# Altium footprint library Gate Driver Board.PcbLib: 123 footprints (part 2 of 8)
Each footprint in its own frame and in the unit in brackets; x right, y up, seen from the top. Pads: shape width x height; smd on the part's side, far side on the other; paste and mask are expansions set on the pad; w line width, h text height; cw(c..) or ccw(c..) is an arc to the next point about the centre after c.
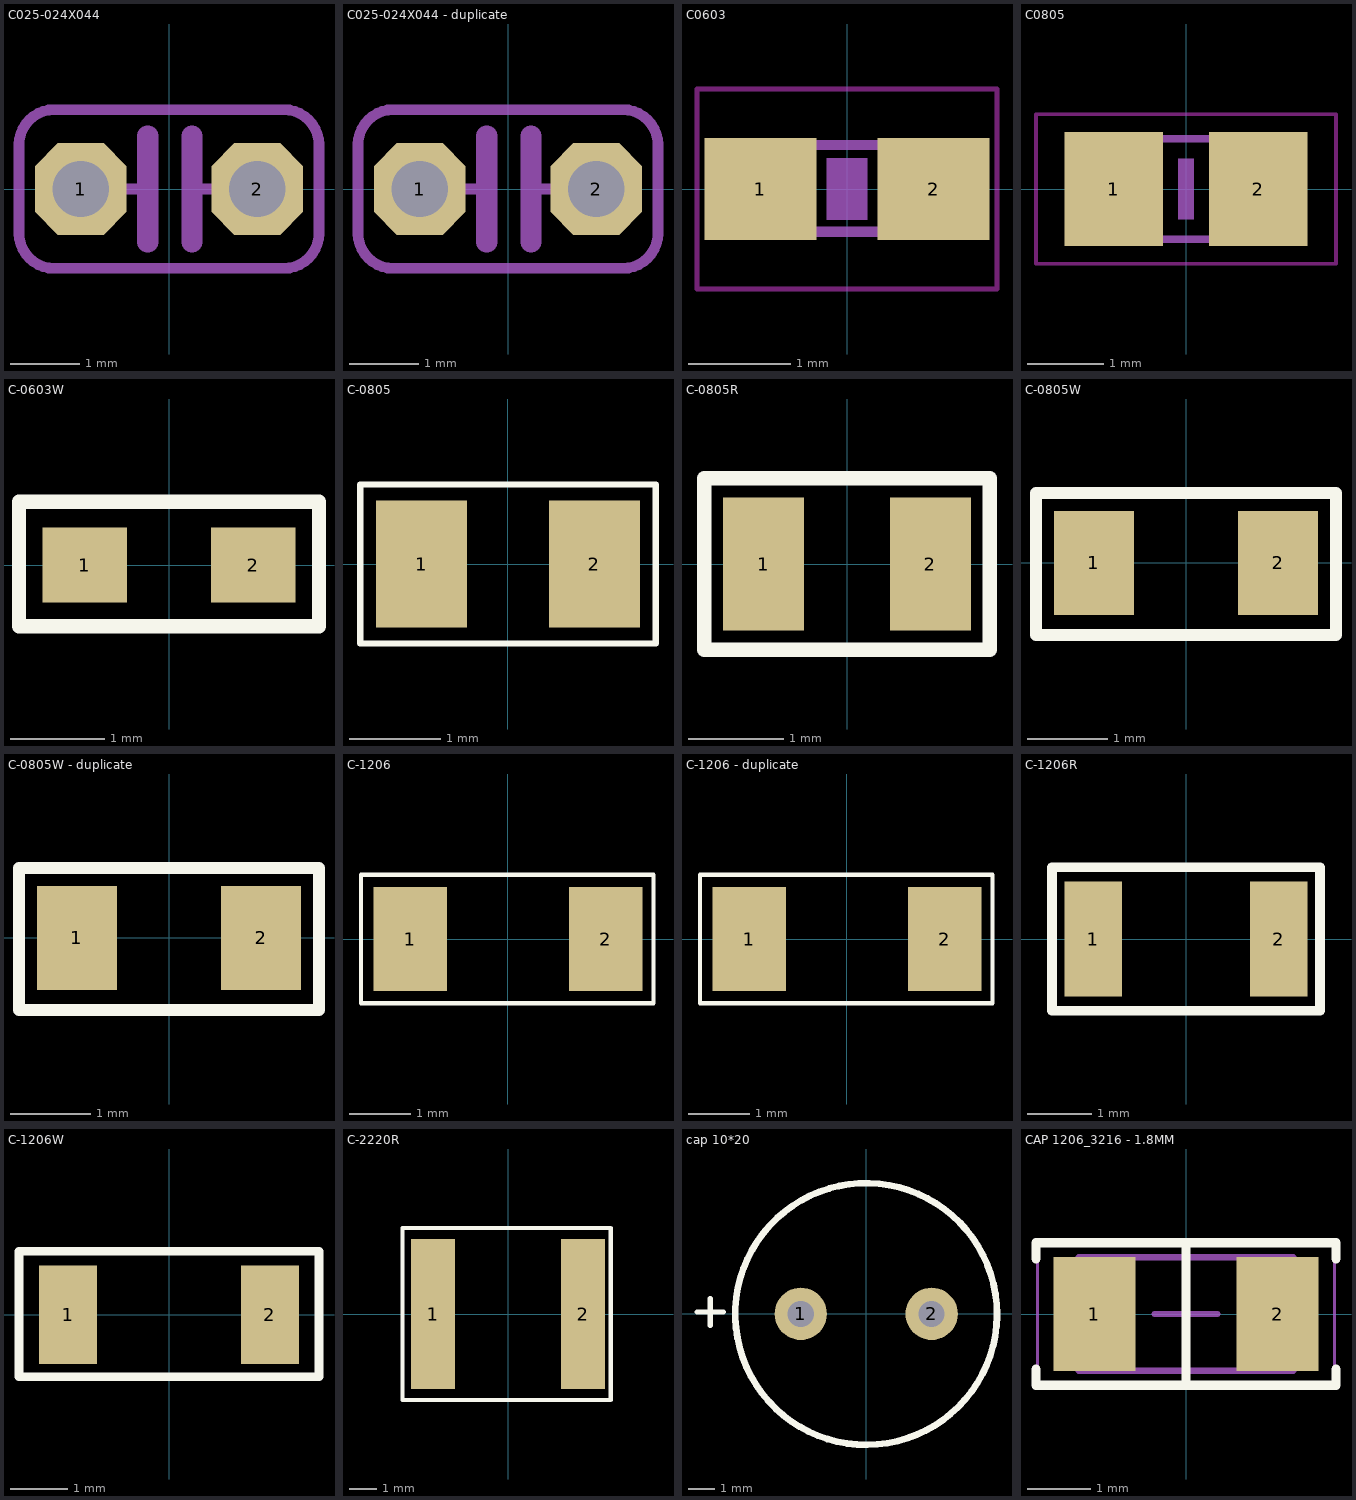
[diagram p1: the footprints below, top view; thin cyan lines are the x and y axes]

## C025-024X044 [mil] "C025-024X044"
pads (2):
  oct 52x52 / inner round 0 / far side oct 52x52 hole 32: 1(-50,0) 2(50,0)
Assembly Bottom:
  lines w6: -50,0 -12,0 ; 13,0 50,0
3D Body Bottom:
  lines w6: -85,-25 ccw(c-65,-25) -65,-45 65,-45 ccw(c65,-25) 85,-25 85,25 ccw(c65,25) 65,45 -65,45 ccw(c-65,25) -85,25 -85,-25
  lines w12: -12,-30 -12,30 ; 13,-30 13,30
3D body: height 150, standoff 0, extent 9.75,-3.25 53.25,3.25
3D body: height 150, standoff 0, extent -53.25,-3.25 -8.75,3.25
3D body: height 50, standoff 0, extent -74.49,-24.49 -25.51,24.49
3D body: height 50, standoff 0, extent 25.51,-24.49 74.49,24.49

## C025-024X044 - duplicate [mil] "C025-024X044"
pads (2):
  oct 52x52 / inner round 0 / far side oct 52x52 hole 32: 1(-50,0) 2(50,0)
Assembly Bottom:
  lines w6: -50,0 -12,0 ; 13,0 50,0
3D Body Bottom:
  lines w6: -85,-25 ccw(c-65,-25) -65,-45 65,-45 ccw(c65,-25) 85,-25 85,25 ccw(c65,25) 65,45 -65,45 ccw(c-65,25) -85,25 -85,-25
  lines w12: -12,-30 -12,30 ; 13,-30 13,30
3D body: height 50, standoff 0, extent 25.51,-24.49 74.49,24.49
3D body: height 50, standoff 0, extent -74.49,-24.49 -25.51,24.49
3D body: height 150, standoff 0, extent -53.25,-3.25 -8.75,3.25
3D body: height 150, standoff 0, extent 9.75,-3.25 53.25,3.25

## C0603 [mm] "C0603"
pads (2):
  rect 1.1x1 smd: 1(-0.85,0) 2(0.85,0)
Top Layer keep-out:
  lines w0.051: -1.473,-0.983 1.473,-0.983 1.473,0.983 -1.473,0.983 -1.473,-0.983
Assembly Bottom:
  region: -0.838,-0.47 -0.838,0.48 -0.338,0.48 -0.338,-0.47
  region: 0.33,-0.47 0.33,0.48 0.83,0.48 0.83,-0.47
  lines w0.102: -0.356,-0.419 0.356,-0.419 ; -0.356,0.432 0.356,0.432
Top Glue Points:
  region: -0.2,-0.3 -0.2,0.3 0.2,0.3 0.2,-0.3

## C0805 [mm] "C0805"
pads (2):
  rect 1.3x1.5 smd: 1(-0.95,0) 2(0.95,0)
Top Layer keep-out:
  lines w0.051: -1.973,-0.983 1.973,-0.983 1.973,0.983 -1.973,0.983 -1.973,-0.983
Assembly Bottom:
  region: -1.092,-0.724 -1.092,0.726 -0.342,0.726 -0.342,-0.724
  region: 0.356,-0.724 0.356,0.726 1.106,0.726 1.106,-0.724
  lines w0.102: -0.381,0.66 0.381,0.66 ; -0.356,-0.66 0.381,-0.66
Top Glue Points:
  region: -0.1,-0.4 -0.1,0.4 0.1,0.4 0.1,-0.4

## C-0603W [mm] "capacitor 0603 wave soldering"
pads (2):
  rect 0.9x0.8 smd: 1(-0.9,0) 2(0.9,0)
Top Overlay:
  lines w0.152: -1.6,-0.65 0.55,-0.65 1.6,-0.65 1.6,0.675 0.525,0.675 -1.6,0.675 -1.6,-0.65
3D body "CAP0603.stp": height 0.3, standoff 0, extent -0.8,-0.4 0.8,0.4

## C-0805 [mm]
pads (2):
  rect 1x1.4 smd: 1(-0.95,0) 2(0.95,0)
Top Overlay:
  lines w0.07: -1.625,-0.875 -1.625,0.413 -1.625,0.875 1.625,0.875 1.625,-0.875 0.416,-0.875 -0.391,-0.875 -1.625,-0.875
3D body "User Library-CAPC2013X10.STEP": height 1.01, standoff 0.01, extent -1,-0.625 1,0.625

## C-0805R [mm] "capacitor 0805 reflow soldering"
pads (2):
  rect 0.85x1.4 smd: 1(-0.875,0) 2(0.875,0)
Top Overlay:
  lines w0.152: -1.5,-0.9 -1.5,0.9 1.5,0.9 1.5,-0.9 0.625,-0.9 -1.5,-0.9
3D body "CAP0805.stp": height 0.78, standoff 0, extent -1,-0.625 1,0.625

## C-0805W [mm] "capacitor 0805 wave soldering"
pads (2):
  rect 1x1.3 smd: 1(-1.15,0) 2(1.15,0)
Top Overlay:
  lines w0.152: -1.875,-0.9 0.6,-0.9 1.875,-0.9 1.875,0.875 0.6,0.875 -1.875,0.875 -1.875,-0.9
3D body "CAP0805.stp": height 0.78, standoff 0, extent -1,-0.625 1,0.625

## C-0805W - duplicate [mm] "capacitor 0805 wave soldering"
pads (2):
  rect 1x1.3 smd: 1(-1.15,0) 2(1.15,0)
Top Overlay:
  lines w0.152: -1.875,-0.9 -1.875,0.875 0.6,0.875 1.875,0.875 1.875,-0.9 0.6,-0.9 -1.875,-0.9
3D body "CAP0805.stp": height 0.78, standoff 0, extent -1,-0.625 1,0.625

## C-1206 [mm]
pads (2):
  rect 1.2x1.7 smd: 1(-1.6,0) 2(1.6,0)
Top Overlay:
  lines w0.07: -2.4,-1.05 2.375,-1.05 2.375,-0.531 2.375,0.556 2.375,0.692 2.375,1.05 -2.4,1.05 -2.4,-1.05
3D body "User Library-CAPC3216X10.STEP": height 1, standoff 0, extent -1.6,-0.8 1.6,0.8

## C-1206 - duplicate [mm]
pads (2):
  rect 1.2x1.7 smd: 1(-1.6,0) 2(1.6,0)
Top Overlay:
  lines w0.07: -2.4,-1.05 2.375,-1.05 2.375,-0.531 2.375,0.556 2.375,0.692 2.375,1.05 -2.4,1.05 -2.4,-1.05
3D body "User Library-CAPC3216X10.STEP": height 1, standoff 0, extent -1.6,-0.8 1.6,0.8

## C-1206R [mm] "capacitor 1206 reflow soldering"
pads (2):
  rect 0.9x1.8 smd: 1(-1.45,0) 2(1.45,0)
Top Overlay:
  lines w0.152: -2.1,-1.125 -2.1,1.125 1.13,1.125 2.1,1.125 2.1,-1.125 -2.1,-1.125
3D body "CAP1206.stp": height 1, standoff 0, extent -1.6,-0.8 1.6,0.8

## C-1206W [mm] "capacitor 1206 wave soldering"
pads (2):
  rect 1x1.7 smd: 1(-1.75,0) 2(1.75,0)
Top Overlay:
  lines w0.152: -2.6,-1.075 2.45,-1.075 2.6,-1.075 2.6,1.1 -2.6,1.1 -2.6,-1.075
3D body "CAP1206.stp": height 1, standoff 0, extent -1.6,-0.8 1.6,0.8

## C-2220R [mm] "capacitor 2220 reflow soldering"
pads (2):
  rect 1.6x5.4 smd: 1(-2.7,0) 2(2.7,0)
Top Overlay:
  lines w0.152: 2.15,-3.1 3.7,-3.1 3.7,3.1 2.15,3.1 ; 2.275,-3.1 -3.8,-3.1 -3.8,3.1 2.525,3.1
3D body "CAP2220.stp": height 2.24, standoff -0.04, extent -2.85,-2.5 2.85,2.5

## cap 10*20 [mm]
pads (2):
  round 2 hole 1: 1(-2.5,0) 2(2.5,0)
Top Overlay:
  lines w0.2: -6.466,0.075 -5.45,0.075 ; -5.958,-0.433 -5.958,0.583
  lines w0.254: 4.996,-0.08 cw(c-0.003,-0.004) 4.997,-0.004
3D body "User Library-CE_R200_D400_H800.STEP": height 20.33, standoff -2.89, extent -5.225,-5.025 4.935,5.134

## CAP 1206_3216 - 1.8MM [mm] "Chip Capacitor, 2-Leads, Body 3.25x1.60mm, IPC Medium Density"
height 1.8
pads (2):
  rect 1.3x1.8 smd: 1(-1.45,0) 2(1.45,0)
Top Overlay:
  lines w0.15: -2.375,-0.875 -2.375,-1.125 2.375,-1.125 2.375,-0.875 ; -2.375,0.875 -2.375,1.125 2.375,1.125 2.375,0.875 ; 0,-1.125 0,1.125
Mechanical 13:
  lines w0.1: -1.7,-0.9 1.7,-0.9 1.7,0.9 -1.7,0.9 -1.7,-0.9
Mechanical 15:
  lines w0.05: -2.35,-1.15 2.35,-1.15 2.35,1.15 -2.35,1.15 -2.35,-1.15
  lines w0.1: -0.5,0 0.5,0 ; 0,-0.5 0,0.5
3D body "CAP 1206-1.8mm.STEP": height 1.8, standoff 0, extent -1.6,-0.8 1.6,0.8